# Altium footprint library Austindetz_CM4_Board_v1.0.PcbLib: 102 footprints (part 5 of 7)
Each footprint in its own frame and in the unit in brackets; x right, y up, seen from the top. Pads: shape width x height; smd on the part's side, far side on the other; paste and mask are expansions set on the pad; w line width, h text height; cw(c..) or ccw(c..) is an arc to the next point about the centre after c.
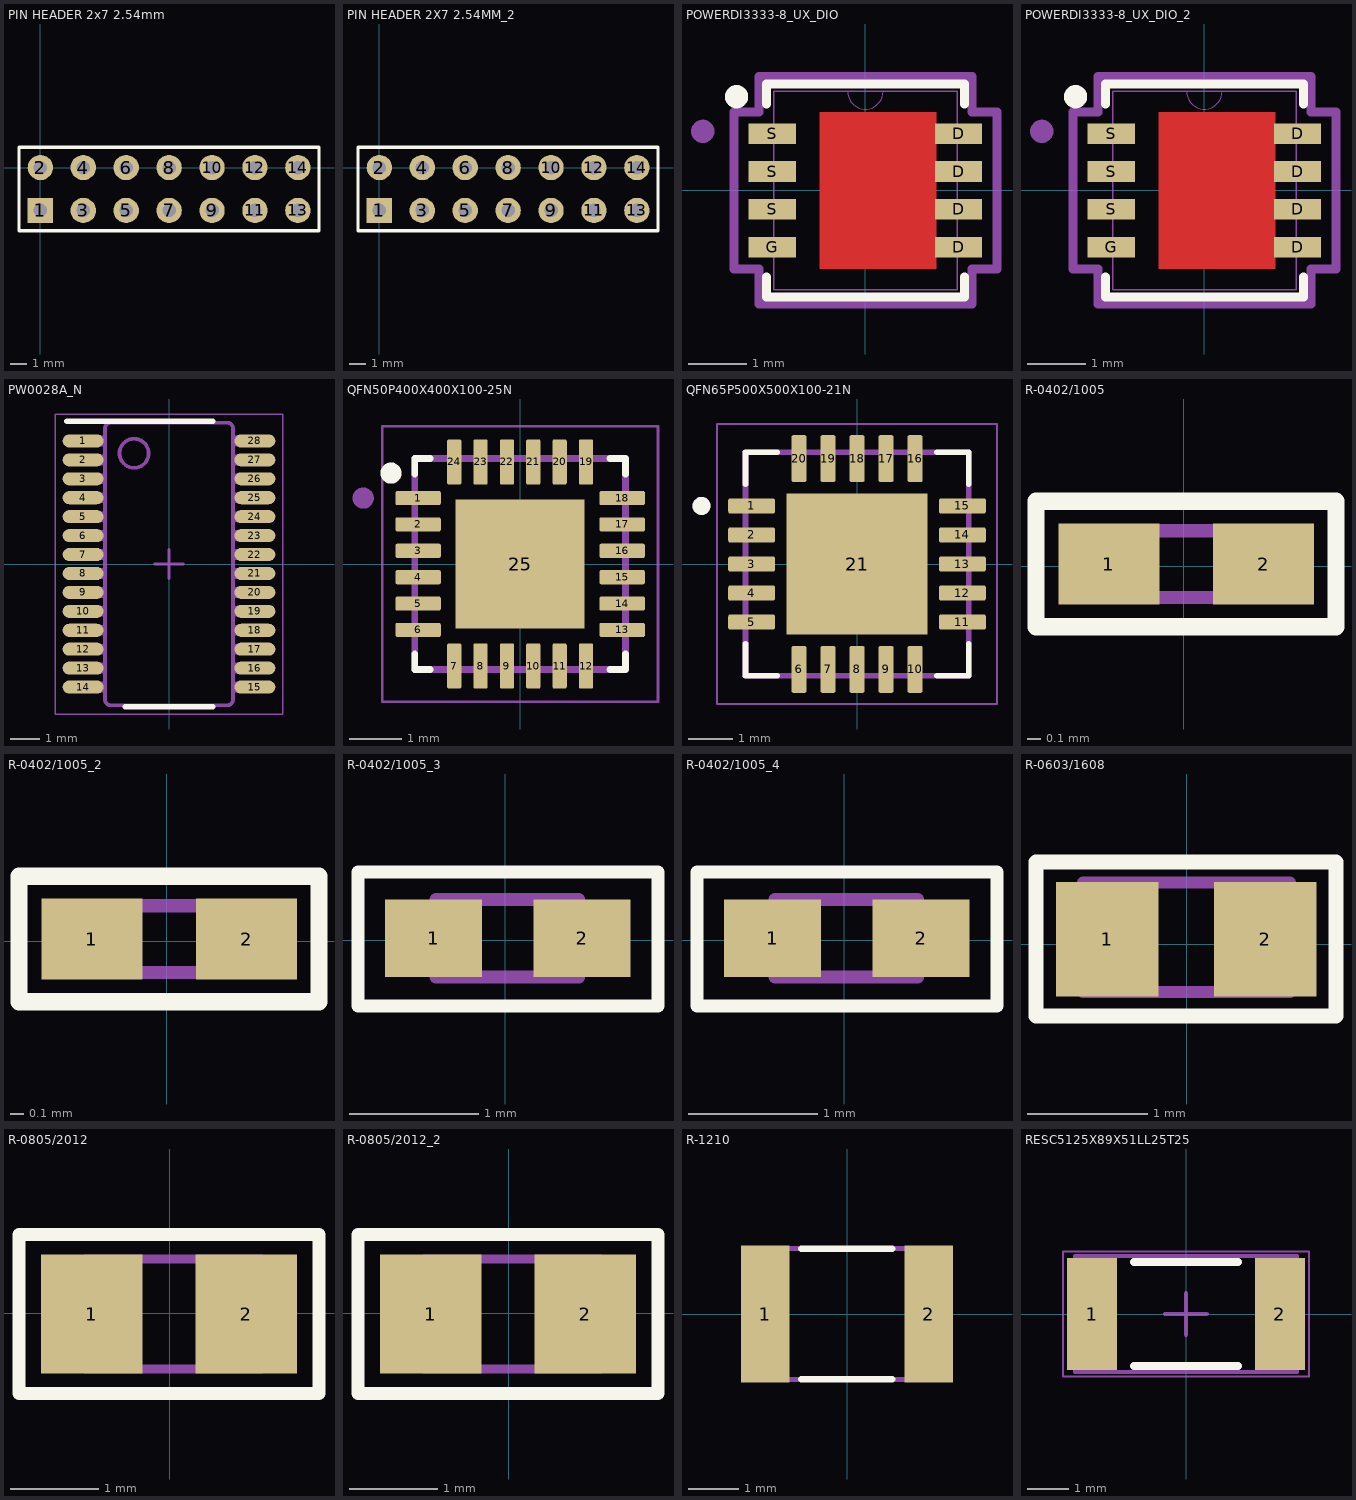
[diagram p4: the footprints below, top view; thin cyan lines are the x and y axes]

## PIN HEADER 2x7 2.54mm [mm]
pads (14):
  rect 1.5x1.5 hole 0.8: 1(0,-2.54)
  round 1.5 hole 0.8: 2(0,0) 3(2.54,-2.54) 4(2.54,0) 5(5.08,-2.54) 6(5.08,0) 7(7.62,-2.54) 8(7.62,0) 9(10.16,-2.54) 10(10.16,0) 11(12.7,-2.54) 12(12.7,0) 13(15.24,-2.54) 14(15.24,0)
Top Overlay:
  lines w0.2: -1.264,-3.745 16.49,-3.745 16.49,1.205 -1.264,1.205 -1.264,-3.745
Top Assembly:
  lines w0.1: -1.257,-3.747 -1.257,1.162 16.477,1.162 16.477,-3.747 -1.257,-3.747
  text "'.Designator'" at 7.884,-2.013 h2
3D body "1x7 TH Vert 100mil.STEP": height 8.48, standoff -3.2, extent -1.27,-3.81 16.51,-1.27
3D body "1x7 TH Vert 100mil.STEP": height 8.48, standoff -3.2, extent -1.271,-1.267 16.509,1.273

## PIN HEADER 2X7 2.54MM_2 [mm]
pads (14):
  rect 1.5x1.5 hole 0.8: 1(0,-2.54)
  round 1.5 hole 0.8: 2(0,0) 3(2.54,-2.54) 4(2.54,0) 5(5.08,-2.54) 6(5.08,0) 7(7.62,-2.54) 8(7.62,0) 9(10.16,-2.54) 10(10.16,0) 11(12.7,-2.54) 12(12.7,0) 13(15.24,-2.54) 14(15.24,0)
Top Overlay:
  lines w0.2: -1.264,-3.745 -1.264,1.205 16.49,1.205 16.49,-3.745 -1.264,-3.745
Top Assembly:
  lines w0.1: -1.257,-3.747 16.477,-3.747 16.477,1.162 -1.257,1.162 -1.257,-3.747
  text "'.Designator'" at 7.884,-2.013 h2
3D body "1x7 TH Vert 100mil.STEP": height 8.48, standoff -3.2, extent -1.271,-1.267 16.509,1.273
3D body "1x7 TH Vert 100mil.STEP": height 8.48, standoff -3.2, extent -1.27,-3.81 16.51,-1.27

## POWERDI3333-8_UX_DIO [mil]
pads (8):
  rect 32x14 smd paste+0 mask+0: D(63,-38.39) D(63,-12.8) D(63,12.8) D(63,38.39) G(-63,-38.39) S(-63,-12.8) S(-63,12.8) S(-63,38.39)
Top Layer:
  region: 48,-53 48,53 -31,53 -31,-53
Top Overlay:
  circle w7.87: c-87.17,63.42 r3.94
  lines w6: -67,-58.49 -67,-72 67,-72 67,-58.49 ; -67,58.49 -67,72 67,72 67,58.49
Top Paste:
  region: 48,-53 48,53 -31,53 -31,-53
Top Solder:
  region: 48,-53 48,53 -31,53 -31,-53
Mechanical 13:
  lines w0: -12,67 ccw(c0,67) 12,67
  lines w1: -62,-67 -62,67 62,67 62,-67 -62,-67
Mechanical 15:
  circle w7.87: c-110,40 r3.94
  lines w6: -89,-53.18 -72,-53.18 -72,-77 72,-77 72,-53.18 89,-53.18 89,53.18 72,53.18 72,77 -72,77 -72,53.18 -89,53.18 -89,-53.18
3D body "POWERDI3333-8_UX_DIO.step": height 33.11, standoff 0, extent -67.01,-67.01 67.01,67.01

## POWERDI3333-8_UX_DIO_2 [mil]
pads (8):
  rect 32x14 smd paste+0 mask+0: D(63,-38.39) D(63,-12.8) D(63,12.8) D(63,38.39) G(-63,-38.39) S(-63,-12.8) S(-63,12.8) S(-63,38.39)
Top Layer:
  region: 48,-53 48,53 -31,53 -31,-53
Top Overlay:
  circle w7.87: c-87.17,63.42 r3.94
  lines w6: -67,-58.49 -67,-72 67,-72 67,-58.49 ; -67,58.49 -67,72 67,72 67,58.49
Top Paste:
  region: 48,-53 48,53 -31,53 -31,-53
Top Solder:
  region: 48,-53 48,53 -31,53 -31,-53
Mechanical 13:
  lines w0: -12,67 ccw(c0,67) 12,67
  lines w1: -62,-67 -62,67 62,67 62,-67 -62,-67
Mechanical 15:
  circle w7.87: c-110,40 r3.94
  lines w6: -89,-53.18 -72,-53.18 -72,-77 72,-77 72,-53.18 89,-53.18 89,53.18 72,53.18 72,77 -72,77 -72,53.18 -89,53.18 -89,-53.18
3D body "POWERDI3333-8_UX_DIO.step": height 33.11, standoff 0, extent -67.01,-67.01 67.01,67.01

## PW0028A_N [mm]
height 3.31
pads (28):
  oval 1.4x0.45 smd paste+0 mask+0.051: 1(-2.95,4.225) 2(-2.95,3.575) 3(-2.95,2.925) 4(-2.95,2.275) 5(-2.95,1.625) 6(-2.95,0.975) 7(-2.95,0.325) 8(-2.95,-0.325) 9(-2.95,-0.975) 10(-2.95,-1.625) 11(-2.95,-2.275) 12(-2.95,-2.925) 13(-2.95,-3.575) 14(-2.95,-4.225) 15(2.95,-4.225) 16(2.95,-3.575) 17(2.95,-2.925) 18(2.95,-2.275) 19(2.95,-1.625) 20(2.95,-0.975) 21(2.95,-0.325) 22(2.95,0.325) 23(2.95,0.975) 24(2.95,1.625) 25(2.95,2.275) 26(2.95,2.925) 27(2.95,3.575) 28(2.95,4.225)
Top Overlay:
  lines w0.2: -3.5,4.9 1.5,4.9 ; -1.5,-4.9 1.5,-4.9
Mechanical 13:
  drawing of 346 lines, arcs and shapes, not listed
Mechanical 15:
  lines w0.05: -3.9,-5.15 -3.9,5.15 3.9,5.15 3.9,-5.15 -3.9,-5.15
  lines w0.1: -0.5,0 0.5,0 ; 0,-0.5 0,0.5

## QFN50P400X400X100-25N [mm]
height 13.32
pads (25):
  rrect25% 0.86x0.27 smd: 1(-1.935,1.25) 2(-1.935,0.75) 3(-1.935,0.25) 4(-1.935,-0.25) 5(-1.935,-0.75) 6(-1.935,-1.25) 13(1.935,-1.25) 14(1.935,-0.75) 15(1.935,-0.25) 16(1.935,0.25) 17(1.935,0.75) 18(1.935,1.25)
  rrect25% 0.27x0.86 smd: 7(-1.25,-1.935) 8(-0.75,-1.935) 9(-0.25,-1.935) 10(0.25,-1.935) 11(0.75,-1.935) 12(1.25,-1.935) 19(1.25,1.935) 20(0.75,1.935) 21(0.25,1.935) 22(-0.25,1.935) 23(-0.75,1.935) 24(-1.25,1.935)
  rect 2.45x2.45 smd paste-0.45: 25(0,0)
Top Overlay:
  circle w0.2: c-2.45,1.723 r0.1
  lines w0.127: -2,-1.705 -2,-2 -1.705,-2 ; -2,1.705 -2,2 -1.705,2 ; 1.705,-2 2,-2 2,-1.705 ; 1.705,2 2,2 2,1.705
Mechanical 13:
  circle w0.2: c-2.975,1.25 r0.1
  lines w0.127: -2,-2 -2,2 2,2 2,-2 -2,-2
Mechanical 15:
  lines w0.05: -2.615,-2.615 -2.615,2.615 2.615,2.615 2.615,-2.615 -2.615,-2.615
3D body "step_temp.STEP": height 1, standoff 0, extent -2,-2 2,2

## QFN65P500X500X100-21N [mm]
pads (21):
  rrect25% 1.05x0.34 smd: 1(-2.36,1.3) 2(-2.36,0.65) 3(-2.36,0) 4(-2.36,-0.65) 5(-2.36,-1.3) 11(2.36,-1.3) 12(2.36,-0.65) 13(2.36,0) 14(2.36,0.65) 15(2.36,1.3)
  rrect25% 0.34x1.05 smd: 6(-1.3,-2.36) 7(-0.65,-2.36) 8(0,-2.36) 9(0.65,-2.36) 10(1.3,-2.36) 16(1.3,2.36) 17(0.65,2.36) 18(0,2.36) 19(-0.65,2.36) 20(-1.3,2.36)
  rect 3.15x3.15 smd paste-3: 21(0,0)
Top Overlay:
  circle w0.2: c-3.485,1.3 r0.1
  lines w0.127: -2.5,-1.79 -2.5,-2.5 -1.79,-2.5 ; -2.5,1.79 -2.5,2.5 -1.79,2.5 ; 1.79,-2.5 2.5,-2.5 2.5,-1.79 ; 1.79,2.5 2.5,2.5 2.5,1.79
Top Paste:
  region: -0.195,-1.195 -1.195,-1.195 -1.195,-0.195 -0.195,-0.195
  region: -0.195,0.195 -1.195,0.195 -1.195,1.195 -0.195,1.195
  region: 1.195,0.195 0.195,0.195 0.195,1.195 1.195,1.195
  region: 1.195,-1.195 0.195,-1.195 0.195,-0.195 1.195,-0.195
Mechanical 13:
  circle w0.2: c-3.485,1.3 r0.1
  lines w0.127: -2.5,-2.5 2.5,-2.5 2.5,2.5 -2.5,2.5 -2.5,-2.5
Mechanical 15:
  lines w0.05: -3.135,-3.135 3.135,-3.135 3.135,3.135 -3.135,3.135 -3.135,-3.135

## R-0402/1005 [mm]
height 1.3
pads (2):
  rect 0.75x0.6 smd: 1(-0.556,0.014) 2(0.594,0.014)
Top Overlay:
  lines w0.127: -1.096,-0.451 1.13,-0.451 1.13,0.481 -1.096,0.481 -1.096,-0.451
Top Assembly:
  lines w0.1: -0.484,-0.234 0.518,-0.234 0.518,0.263 -0.484,0.263 -0.484,-0.234
  text "'.Designator'" at -3.3,-1.6 h1.27
3D body "0402 resistor.STEP": height 0.35, standoff 0, extent -0.482,-0.237 0.518,0.263

## R-0402/1005_2 [mm]
pads (2):
  rect 0.75x0.6 smd: 1(-0.556,0.014) 2(0.594,0.014)
Top Overlay:
  lines w0.127: -1.096,-0.451 -1.096,0.481 1.13,0.481 1.13,-0.451 -1.096,-0.451
Top Assembly:
  lines w0.1: -0.484,-0.234 -0.484,0.263 0.518,0.263 0.518,-0.234 -0.484,-0.234
  text "'.Designator'" at -3.3,-1.6 h1.27
3D body "0402 resistor.STEP": height 0.35, standoff 0, extent -0.482,-0.237 0.518,0.263

## R-0402/1005_3 [mm]
pads (2):
  rect 0.75x0.6 smd: 1(-0.556,0.014) 2(0.594,0.014)
Top Overlay:
  lines w0.1: -1.142,-0.51 1.182,-0.51 1.182,0.526 -1.142,0.526 -1.142,-0.51
Top Assembly:
  lines w0.1: -0.539,-0.287 -0.539,0.315 0.568,0.315 0.568,-0.287 -0.539,-0.287
  text "'.Designator'" at 0.726,1.333 h1.27
3D body "0402 resistor.STEP": height 0.35, standoff 0, extent -0.482,-0.237 0.518,0.263

## R-0402/1005_4 [mm]
pads (2):
  rect 0.75x0.6 smd: 1(-0.556,0.014) 2(0.594,0.014)
Top Overlay:
  lines w0.1: -1.142,-0.51 1.182,-0.51 1.182,0.526 -1.142,0.526 -1.142,-0.51
Top Assembly:
  lines w0.1: -0.539,-0.287 -0.539,0.315 0.568,0.315 0.568,-0.287 -0.539,-0.287
  text "'.Designator'" at 0.726,1.333 h1.27
3D body "0402 resistor.STEP": height 0.35, standoff 0, extent -0.482,-0.237 0.518,0.263

## R-0603/1608 [mm] "Chip Resistor, 2-Leads, Body 1.60x0.80mm, IPC Medium Density"
height 0.45
pads (2):
  rect 0.85x0.95 smd: 1(-0.659,0.042) 2(0.651,0.042)
Top Overlay:
  lines w0.127: -1.249,-0.594 -1.249,0.682 1.239,0.682 1.239,-0.594 -1.249,-0.594
Top Assembly:
  lines w0.1: -0.86,-0.394 0.858,-0.394 0.858,0.512 -0.801,0.512 -0.86,0.512 -0.86,-0.394
  text "'.Designator'" at -3.112,-1.801 h1.27
3D body "0603 resistor.STEP": height 0.45, standoff 0, extent -0.799,-0.348 0.801,0.452

## R-0805/2012 [mm] "Chip Capacitor, 2-Leads, Body 2.00x1.20mm, IPC Medium Density"
height 1.15
pads (2):
  rect 1.15x1.35 smd: 1(-0.883,-0.009) 2(0.867,-0.009)
Top Overlay:
  lines w0.15: -1.708,-0.909 -1.708,-0.709 -1.708,0.891 1.692,0.891 1.692,0.691 1.692,-0.909 -1.708,-0.909
Top Assembly:
  lines w0.1: -0.958,-0.634 -0.958,0.616 1.042,0.616 1.042,-0.634 -0.958,-0.634
  text "'.Designator'" at 1.067,-0.924 h1.27
3D body "RESC-0805.stp": height 0.6, standoff 0, extent -1.05,-0.675 1.05,0.675

## R-0805/2012_2 [mm]
pads (2):
  rect 1.15x1.35 smd: 1(-0.883,-0.009) 2(0.867,-0.009)
Top Overlay:
  lines w0.15: -1.708,-0.909 1.692,-0.909 1.692,0.691 1.692,0.891 -1.708,0.891 -1.708,-0.709 -1.708,-0.909
Top Assembly:
  lines w0.1: -0.958,-0.634 1.042,-0.634 1.042,0.616 -0.958,0.616 -0.958,-0.634
  text "'.Designator'" at 1.067,-0.924 h1.27
3D body "RESC-0805.stp": height 0.6, standoff 0, extent -1.05,-0.675 1.05,0.675

## R-1210 [mm]
pads (2):
  rect 0.96x2.72 smd: 1(-1.625,0) 2(1.625,0)
Top Overlay:
  lines w0.127: -0.914,-1.3 0.599,-1.3 0.9,-1.3 ; -0.914,1.3 0.9,1.3
Top Assembly:
  lines w0.1: -1.7,-1.3 -1.7,1.3 -1,1.3 1.7,1.3 1.7,-1.3 -1.7,-1.3
  text "'.Designator'" at -3.356,-2.788 h1.27
3D body: height 1, standoff 0, extent -1.7,-1.3 1.7,1.3

## RESC5125X89X51LL25T25 [mm] "Chip Resistor, 2-Leads, Body 5.33x2.79mm, IPC High Density"
height 0.89
pads (2):
  rect 1.2x2.7 smd: 1(-2.25,0) 2(2.25,0)
Top Overlay:
  lines w0.2: -1.25,-1.25 1.25,-1.25 ; -1.25,1.25 1.25,1.25
Mechanical 13:
  lines w0.1: -2.665,-1.395 2.665,-1.395 2.665,1.395 -2.665,1.395 -2.665,-1.395
Mechanical 15:
  lines w0.05: -2.95,-1.5 2.95,-1.5 2.95,1.5 -2.95,1.5 -2.95,-1.5
  lines w0.1: -0.5,0 0.5,0 ; 0,-0.5 0,0.5
3D body "RESC5125X09L.step": height 0.89, standoff 0, extent -2.665,-1.395 2.665,1.395